# Altium footprint library Libraries_2014_0618.PcbLib: 391 footprints (part 10 of 25)
Each footprint in its own frame and in the unit in brackets; x right, y up, seen from the top. Pads: shape width x height; smd on the part's side, far side on the other; paste and mask are expansions set on the pad; w line width, h text height; cw(c..) or ccw(c..) is an arc to the next point about the centre after c.
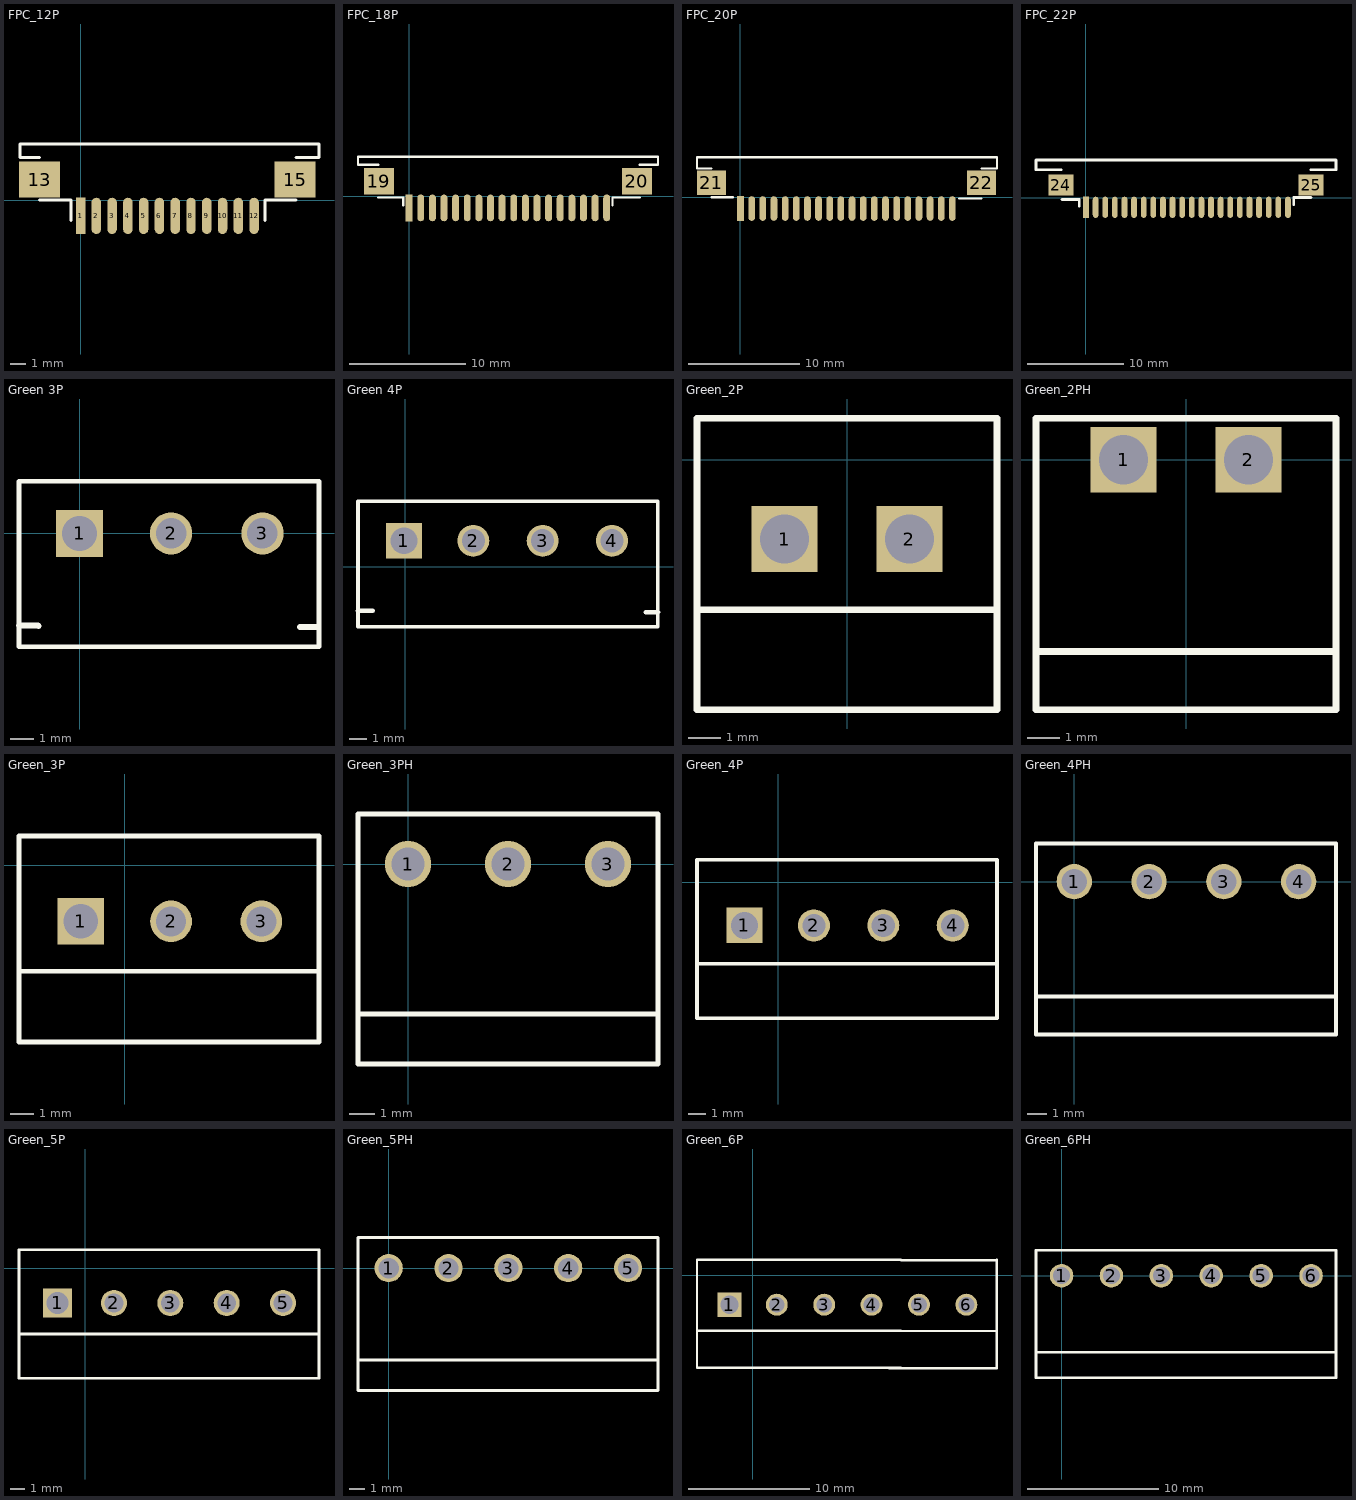
[diagram p9: the footprints below, top view; thin cyan lines are the x and y axes]

## FPC_12P [mm]
pads (14):
  rect 0.6x2.3 smd: 1(0,-1)
  oval 0.6x2.3 smd: 2(1,-1) 3(2,-1) 4(3,-1) 5(4,-1) 6(5,-1) 7(6,-1) 8(7,-1) 9(8,-1) 10(9,-1) 11(10,-1) 12(11,-1)
  rect 2.6x2.3 smd: 13(-2.6,1.3) 15(13.6,1.3)
Top Overlay:
  lines w0.2: -2.6,0 -0.6,0 -0.6,-1.3 ; -2.6,2.7 -3.835,2.7 -3.835,3.556 15.113,3.556 15.113,2.7 13.665,2.7 ; 11.7,-1.3 11.7,0 13.665,0

## FPC_18P [mm]
pads (20):
  rect 0.6x2.3 smd: 1(0,-1)
  oval 0.6x2.3 smd: 2(1,-1) 3(2,-1) 4(3,-1) 5(4,-1) 6(5,-1) 7(6,-1) 8(7,-1) 9(8,-1) 10(9,-1) 11(10,-1) 12(11,-1) 13(12,-1) 14(13,-1) 15(14,-1) 16(15,-1) 17(16,-1) 18(17,-1)
  rect 2.6x2.3 smd: 19(-2.6,1.3) 20(19.6,1.295)
Top Overlay:
  lines w0.2: -2.667,-0.1 -0.5,-0.1 -0.5,-0.787 ; -2.667,2.7 -4.4,2.7 -4.4,3.404 21.412,3.404 21.412,2.7 19.837,2.7 ; 17.501,-0.787 17.501,-0.1 17.701,-0.1 19.837,-0.1

## FPC_20P [mm]
pads (22):
  rect 0.6x2.2 smd: 1(0,-1)
  oval 0.6x2.2 smd: 2(1,-1) 3(2,-1) 4(3,-1) 5(4,-1) 6(5,-1) 7(6,-1) 8(7,-1) 9(8,-1) 10(9,-1) 11(10,-1) 12(11,-1) 13(12,-1) 14(13,-1) 15(14,-1) 16(15,-1) 17(16,-1) 18(17,-1) 19(18,-1) 20(19,-1)
  rect 2.6x2.2 smd: 21(-2.6,1.3) 22(21.6,1.3)
Top Overlay:
  lines w0.2: -2.6,0 -0.7,0 ; -2.6,2.6 -3.9,2.6 -3.9,3.6 23,3.6 23,2.6 21.6,2.6 ; 19.6,-0.1 21.6,-0.1

## FPC_22P [mm]
pads (24):
  rect 0.6x2.2 smd: 1(0,-1)
  oval 0.6x2.2 smd: 2(1,-1) 3(2,-1) 4(3,-1) 5(4,-1) 6(5,-1) 7(6,-1) 8(7,-1) 9(8,-1) 10(9,-1) 11(10,-1) 12(11,-1) 13(12,-1) 14(13,-1) 15(14,-1) 16(15,-1) 17(16,-1) 18(17,-1) 19(18,-1) 20(19,-1) 21(20,-1) 22(21,-1)
  rect 2.6x2.2 smd: 24(-2.6,1.3) 25(23.4,1.3)
Top Overlay:
  lines w0.3: -2.6,2.9 -5.2,2.9 -5.2,3.9 26,3.9 26,2.9 23.4,2.9 ; -2.5,-0.2 -0.7,-0.2 -0.7,-0.9 ; 21.6,-0.7 21.6,0 23.4,0

## Green 3P [mm]
pads (3):
  rect 2x2 hole 1.5: 1(0.004,-0.012)
  round 1.8 hole 1.3: 2(3.904,-0.012) 3(7.804,-0.012)
Top Overlay:
  lines w0.2: -2.582,-4.853 10.215,-4.853 10.215,2.217 -2.582,2.217 -2.582,-4.853
  lines w0.254: -2.582,-3.938 -1.774,-3.938 -1.755,-3.957 ; 9.407,-3.997 10.105,-3.997

## Green 4P [mm]
pads (4):
  rect 2x2 hole 1.5: 1(-0.071,1.471)
  round 1.8 hole 1.3: 2(3.829,1.471) 3(7.729,1.471) 4(11.629,1.471)
Top Overlay:
  lines w0.2: 14.107,3.7 -2.657,3.7 -2.657,-3.369 14.197,-3.369 14.197,3.7
  lines w0.254: -2.657,-2.455 -1.849,-2.455 -1.831,-2.474 ; 13.519,-2.547 14.217,-2.547

## Green_2P [mm]
pads (2):
  rect 2x2 hole 1.5: 1(-1.905,-2.413) 2(1.905,-2.413)
Top Overlay:
  lines w0.2: -4.572,-4.572 4.572,-4.572 ; -4.572,-7.62 -4.572,1.27 4.572,1.27 4.572,-7.62 -4.572,-7.62

## Green_2PH [mm]
pads (2):
  rect 2x2 hole 1.5: 1(-1.905,0) 2(1.905,0)
Top Overlay:
  lines w0.2: -4.572,-5.842 4.572,-5.842 ; -4.572,-7.62 4.572,-7.62 4.572,1.27 -4.572,1.27 -4.572,-7.62

## Green_3P [mm]
pads (3):
  rect 2x2 hole 1.5: 1(-1.905,-2.413)
  round 1.8 hole 1.3: 2(1.995,-2.413) 3(5.895,-2.413)
Top Overlay:
  lines w0.2: -4.572,-4.572 8.382,-4.572 ; -4.572,-7.62 -4.572,1.27 8.382,1.27 8.382,-7.62 -4.572,-7.62

## Green_3PH [mm]
pads (3):
  round 1.8 hole 1.3: 1(0,0) 2(3.9,0) 3(7.8,0)
Top Overlay:
  lines w0.2: -1.95,-5.85 -1.95,-7.8 9.75,-7.8 9.75,-5.85 ; -1.95,-5.85 -1.95,-3.9 -1.95,1.95 9.75,1.95 9.75,-3.9 9.75,-5.85 ; -1.95,-5.85 9.75,-5.85

## Green_4P [mm]
pads (4):
  rect 2x2 hole 1.5: 1(-1.905,-2.413)
  round 1.8 hole 1.3: 2(1.995,-2.413) 3(5.895,-2.413) 4(9.795,-2.413)
Top Overlay:
  lines w0.2: -4.572,-4.572 8.382,-4.572 ; -0.762,-7.62 12.192,-7.62 ; -0.762,-4.572 12.192,-4.572 ; 8.382,-7.62 -4.572,-7.62 -4.572,1.27 12.192,1.27 ; 12.282,-7.62 12.282,1.27

## Green_4PH [mm]
pads (4):
  round 1.8 hole 1.3: 1(0,0) 2(3.81,0) 3(7.62,0) 4(11.43,0)
Top Overlay:
  lines w0.2: 13.335,-5.85 -1.95,-5.85 ; -1.95,-5.85 -1.95,-7.8 13.335,-7.8 13.335,1.95 -1.95,1.95 -1.95,-5.85

## Green_5P [mm]
pads (5):
  rect 2x2 hole 1.5: 1(-1.905,-2.413)
  round 1.8 hole 1.3: 2(1.995,-2.413) 3(5.895,-2.413) 4(9.795,-2.413) 5(13.695,-2.413)
Top Overlay:
  lines w0.2: -4.572,-4.572 8.382,-4.572 ; -0.762,-7.62 12.192,-7.62 16.129,-7.62 ; -0.762,-4.572 12.192,-4.572 16.129,-4.572 ; 8.382,-7.62 -4.572,-7.62 -4.572,1.27 16.129,1.27 ; 16.182,-7.62 16.182,1.27

## Green_5PH [mm]
pads (5):
  round 1.8 hole 1.3: 1(0,0) 2(3.81,0) 3(7.62,0) 4(11.43,0) 5(15.24,0)
Top Overlay:
  lines w0.2: 17.145,-5.85 -1.95,-5.85 ; -1.95,-5.85 -1.95,-7.8 13.65,-7.8 17.145,-7.8 17.145,1.95 -1.95,1.95 -1.95,-5.85

## Green_6P [mm]
pads (6):
  rect 2x2 hole 1.5: 1(-1.905,-2.413)
  round 1.8 hole 1.3: 2(1.995,-2.413) 3(5.895,-2.413) 4(9.795,-2.413) 5(13.695,-2.413) 6(17.595,-2.413)
Top Overlay:
  lines w0.2: -4.572,-4.572 8.382,-4.572 ; -0.762,-7.62 12.192,-7.62 ; -0.762,-4.572 12.192,-4.572 ; 8.382,-7.62 -4.572,-7.62 -4.572,1.27 12.192,1.27 ; 11.227,-7.629 20.117,-7.629 ; 12.167,-4.581 20.015,-4.581 ; 12.217,1.261 20.041,1.261 ; 20.082,-7.62 20.082,1.27

## Green_6PH [mm]
pads (6):
  round 1.8 hole 1.3: 1(0,0) 2(3.81,0) 3(7.62,0) 4(11.43,0) 5(15.24,0) 6(19.05,0)
Top Overlay:
  lines w0.2: 20.955,-5.85 -1.95,-5.85 ; -1.95,-5.85 -1.95,1.95 20.955,1.95 20.955,-7.8 13.65,-7.8 -1.95,-7.8 -1.95,-5.85